# Altium integrated library Weidmueller_OMNIMATE_Signal.IntLib: 2550 symbols (part 19 of 45) (continued)
## 1727850000 (continued)
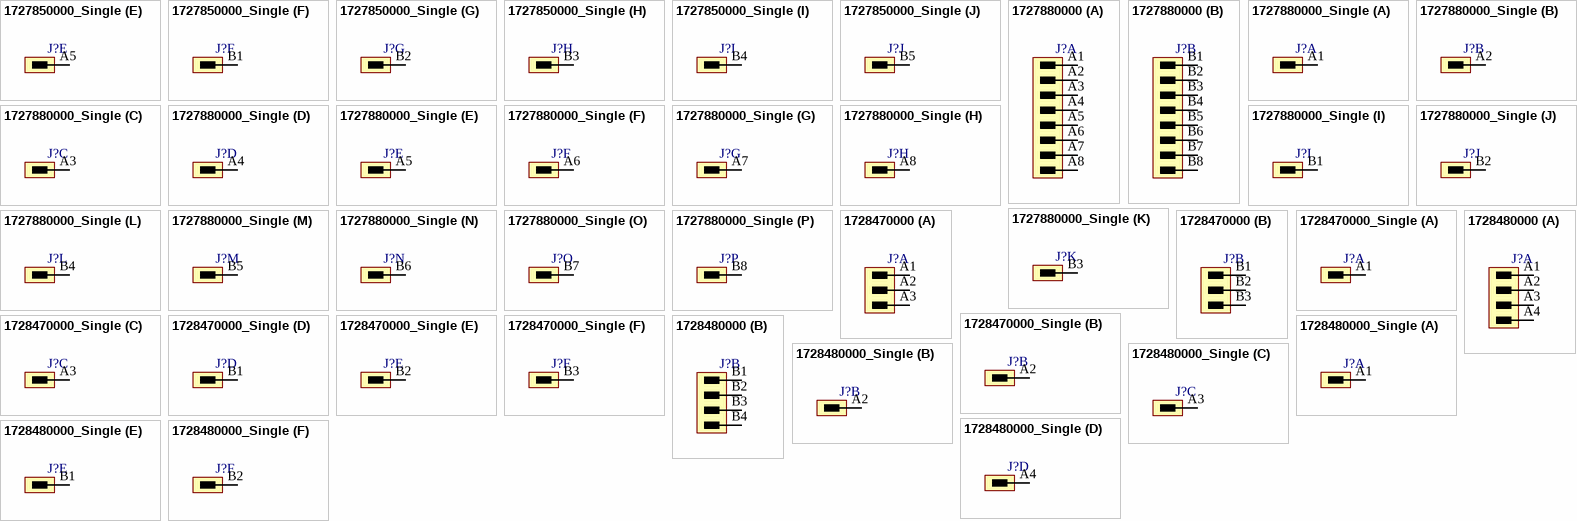
[diagram p105: symbols 1727850000_Single to 1728480000_Single]

## 1727850000_Single
designator J?
OMNIMATE Signal - series B2L/S2L 3.50 - 2-row; PartNumber: 1727850000; Manufacturer: Weidmueller; Short_text_for_material: S2L 3.50/10/90G 3.5SN OR BX; Side_termination_characteristic: closed side; Mounting_onto_the_PCB: Solder connection; Pitch_mm: 3.5 mm; Pitch_inch: 0.138 inch; No_of_poles: 10; Outgoing_elbow: 90°; Contact_material: Cu-Leg; Contact_surface: tinned; Insulating_material: PBT; UL_94_flammability_rating: V-0; Rated_voltage_for_surge_voltage_class_pollution_degree_II_2: 250 V; Rated_voltage_use_group_B_UL_1059: 150 V; Rated_current_use_group_B_UL_1059: 10 A; PackageReference: S2L_3_50_90G_10; Colour: Orange; Solder_pin_length_mm: 3.5 mm; Packaging: Box; Qty: 50 PCS; Revision: V1; ComponentLink1Description: Manufacturer URL; ComponentLink1URL: http://www.weidmueller.com/; ComponentLink2Description: URL Link1; ComponentLink2URL: http://catalog.weidmueller.com/catalog/Start.do?localeId=en&ObjectID=1727850000
footprint S2L_3_50_90G_10 (OMNIMATE Signal - Serie B2L/S2L 3.50 - 2-reihig  S2L 3.50/10/90G 3.5)
part A pins: A1
part B pins: A2
part C pins: A3
part D pins: A4
part E pins: A5
part F pins: B1
part G pins: B2
part H pins: B3
part I pins: B4
part J pins: B5

## 1727880000
designator J?
OMNIMATE Signal - series B2L/S2L 3.50 - 2-row; PartNumber: 1727880000; Manufacturer: Weidmueller; Short_text_for_material: S2L 3.50/16/90G 3.5SN OR BX; Side_termination_characteristic: closed side; Mounting_onto_the_PCB: Solder connection; Pitch_mm: 3.5 mm; Pitch_inch: 0.138 inch; No_of_poles: 16; Outgoing_elbow: 90°; Contact_material: Cu-Leg; Contact_surface: tinned; Insulating_material: PBT; UL_94_flammability_rating: V-0; Rated_voltage_for_surge_voltage_class_pollution_degree_II_2: 250 V; Rated_voltage_use_group_B_UL_1059: 150 V; Rated_current_use_group_B_UL_1059: 10 A; PackageReference: S2L_3_50_90G_16; Colour: Orange; Solder_pin_length_mm: 3.5 mm; Packaging: Box; Qty: 50 PCS; Revision: V1; ComponentLink1Description: Manufacturer URL; ComponentLink1URL: http://www.weidmueller.com/; ComponentLink2Description: URL Link1; ComponentLink2URL: http://catalog.weidmueller.com/catalog/Start.do?localeId=en&ObjectID=1727880000
footprint S2L_3_50_90G_16 (OMNIMATE Signal - Serie B2L/S2L 3.50 - 2-reihig  S2L 3.50/16/90G 3.5)
part A pins: A1, A2, A3, A4, A5, A6, A7, A8
part B pins: B1, B2, B3, B4, B5, B6, B7, B8

## 1727880000_Single
designator J?
OMNIMATE Signal - series B2L/S2L 3.50 - 2-row; PartNumber: 1727880000; Manufacturer: Weidmueller; Short_text_for_material: S2L 3.50/16/90G 3.5SN OR BX; Side_termination_characteristic: closed side; Mounting_onto_the_PCB: Solder connection; Pitch_mm: 3.5 mm; Pitch_inch: 0.138 inch; No_of_poles: 16; Outgoing_elbow: 90°; Contact_material: Cu-Leg; Contact_surface: tinned; Insulating_material: PBT; UL_94_flammability_rating: V-0; Rated_voltage_for_surge_voltage_class_pollution_degree_II_2: 250 V; Rated_voltage_use_group_B_UL_1059: 150 V; Rated_current_use_group_B_UL_1059: 10 A; PackageReference: S2L_3_50_90G_16; Colour: Orange; Solder_pin_length_mm: 3.5 mm; Packaging: Box; Qty: 50 PCS; Revision: V1; ComponentLink1Description: Manufacturer URL; ComponentLink1URL: http://www.weidmueller.com/; ComponentLink2Description: URL Link1; ComponentLink2URL: http://catalog.weidmueller.com/catalog/Start.do?localeId=en&ObjectID=1727880000
footprint S2L_3_50_90G_16 (OMNIMATE Signal - Serie B2L/S2L 3.50 - 2-reihig  S2L 3.50/16/90G 3.5)
part A pins: A1
part B pins: A2
part C pins: A3
part D pins: A4
part E pins: A5
part F pins: A6
part G pins: A7
part H pins: A8
part I pins: B1
part J pins: B2
part K pins: B3
part L pins: B4
part M pins: B5
part N pins: B6
part O pins: B7
part P pins: B8

## 1728470000
designator J?
OMNIMATE Signal - series B2L/S2L 3.50 - 2-row; PartNumber: 1728470000; Manufacturer: Weidmueller; Short_text_for_material: S2L 3.50/06/90F 3.5SN OR BX; Side_termination_characteristic: Flange; Mounting_onto_the_PCB: Solder connection; Pitch_mm: 3.5 mm; Pitch_inch: 0.138 inch; No_of_poles: 6; Outgoing_elbow: 90°; Contact_material: Cu-Leg; Contact_surface: tinned; Insulating_material: PBT; UL_94_flammability_rating: V-0; Rated_voltage_for_surge_voltage_class_pollution_degree_II_2: 250 V; Rated_voltage_use_group_B_UL_1059: 150 V; Rated_current_use_group_B_UL_1059: 10 A; PackageReference: S2L_3_50_90F_06; Colour: Orange; Solder_pin_length_mm: 3.5 mm; Packaging: Box; Qty: 50 PCS; Revision: V1; ComponentLink1Description: Manufacturer URL; ComponentLink1URL: http://www.weidmueller.com/; ComponentLink2Description: URL Link1; ComponentLink2URL: http://catalog.weidmueller.com/catalog/Start.do?localeId=en&ObjectID=1728470000
footprint S2L_3_50_90F_06 (OMNIMATE Signal - Serie B2L/S2L 3.50 - 2-reihig  S2L 3.50/06/90F 3.5)
part A pins: A1, A2, A3
part B pins: B1, B2, B3

## 1728470000_Single
designator J?
OMNIMATE Signal - series B2L/S2L 3.50 - 2-row; PartNumber: 1728470000; Manufacturer: Weidmueller; Short_text_for_material: S2L 3.50/06/90F 3.5SN OR BX; Side_termination_characteristic: Flange; Mounting_onto_the_PCB: Solder connection; Pitch_mm: 3.5 mm; Pitch_inch: 0.138 inch; No_of_poles: 6; Outgoing_elbow: 90°; Contact_material: Cu-Leg; Contact_surface: tinned; Insulating_material: PBT; UL_94_flammability_rating: V-0; Rated_voltage_for_surge_voltage_class_pollution_degree_II_2: 250 V; Rated_voltage_use_group_B_UL_1059: 150 V; Rated_current_use_group_B_UL_1059: 10 A; PackageReference: S2L_3_50_90F_06; Colour: Orange; Solder_pin_length_mm: 3.5 mm; Packaging: Box; Qty: 50 PCS; Revision: V1; ComponentLink1Description: Manufacturer URL; ComponentLink1URL: http://www.weidmueller.com/; ComponentLink2Description: URL Link1; ComponentLink2URL: http://catalog.weidmueller.com/catalog/Start.do?localeId=en&ObjectID=1728470000
footprint S2L_3_50_90F_06 (OMNIMATE Signal - Serie B2L/S2L 3.50 - 2-reihig  S2L 3.50/06/90F 3.5)
part A pins: A1
part B pins: A2
part C pins: A3
part D pins: B1
part E pins: B2
part F pins: B3

## 1728480000
designator J?
OMNIMATE Signal - series B2L/S2L 3.50 - 2-row; PartNumber: 1728480000; Manufacturer: Weidmueller; Short_text_for_material: S2L 3.50/08/90F 3.5SN OR BX; Side_termination_characteristic: Flange; Mounting_onto_the_PCB: Solder connection; Pitch_mm: 3.5 mm; Pitch_inch: 0.138 inch; No_of_poles: 8; Outgoing_elbow: 90°; Contact_material: Cu-Leg; Contact_surface: tinned; Insulating_material: PBT; UL_94_flammability_rating: V-0; Rated_voltage_for_surge_voltage_class_pollution_degree_II_2: 250 V; Rated_voltage_use_group_B_UL_1059: 150 V; Rated_current_use_group_B_UL_1059: 10 A; PackageReference: S2L_3_50_90F_08; Colour: Orange; Solder_pin_length_mm: 3.5 mm; Packaging: Box; Qty: 50 PCS; Revision: V1; ComponentLink1Description: Manufacturer URL; ComponentLink1URL: http://www.weidmueller.com/; ComponentLink2Description: URL Link1; ComponentLink2URL: http://catalog.weidmueller.com/catalog/Start.do?localeId=en&ObjectID=1728480000
footprint S2L_3_50_90F_08 (OMNIMATE Signal - Serie B2L/S2L 3.50 - 2-reihig  S2L 3.50/08/90F 3.5)
part A pins: A1, A2, A3, A4
part B pins: B1, B2, B3, B4

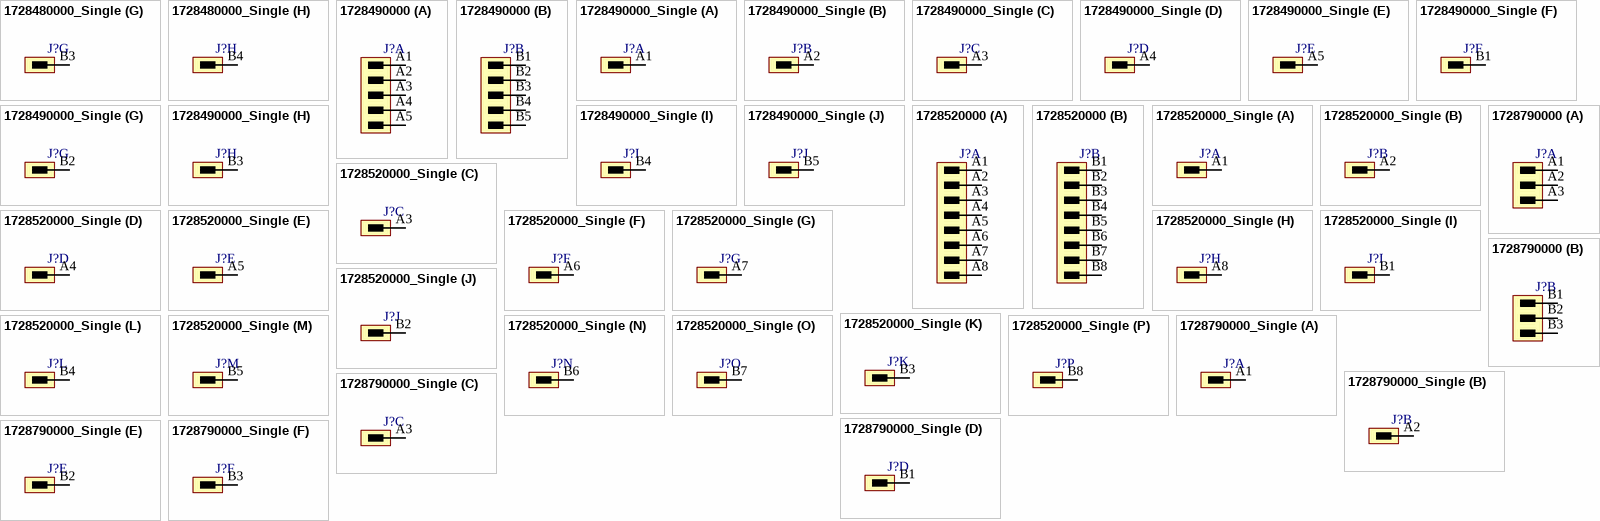
[diagram p106: symbols 1728480000_Single to 1728790000_Single]

## 1728480000_Single
designator J?
OMNIMATE Signal - series B2L/S2L 3.50 - 2-row; PartNumber: 1728480000; Manufacturer: Weidmueller; Short_text_for_material: S2L 3.50/08/90F 3.5SN OR BX; Side_termination_characteristic: Flange; Mounting_onto_the_PCB: Solder connection; Pitch_mm: 3.5 mm; Pitch_inch: 0.138 inch; No_of_poles: 8; Outgoing_elbow: 90°; Contact_material: Cu-Leg; Contact_surface: tinned; Insulating_material: PBT; UL_94_flammability_rating: V-0; Rated_voltage_for_surge_voltage_class_pollution_degree_II_2: 250 V; Rated_voltage_use_group_B_UL_1059: 150 V; Rated_current_use_group_B_UL_1059: 10 A; PackageReference: S2L_3_50_90F_08; Colour: Orange; Solder_pin_length_mm: 3.5 mm; Packaging: Box; Qty: 50 PCS; Revision: V1; ComponentLink1Description: Manufacturer URL; ComponentLink1URL: http://www.weidmueller.com/; ComponentLink2Description: URL Link1; ComponentLink2URL: http://catalog.weidmueller.com/catalog/Start.do?localeId=en&ObjectID=1728480000
footprint S2L_3_50_90F_08 (OMNIMATE Signal - Serie B2L/S2L 3.50 - 2-reihig  S2L 3.50/08/90F 3.5)
part A pins: A1
part B pins: A2
part C pins: A3
part D pins: A4
part E pins: B1
part F pins: B2
part G pins: B3
part H pins: B4

## 1728490000
designator J?
OMNIMATE Signal - series B2L/S2L 3.50 - 2-row; PartNumber: 1728490000; Manufacturer: Weidmueller; Short_text_for_material: S2L 3.50/10/90F 3.5SN OR BX; Side_termination_characteristic: Flange; Mounting_onto_the_PCB: Solder connection; Pitch_mm: 3.5 mm; Pitch_inch: 0.138 inch; No_of_poles: 10; Outgoing_elbow: 90°; Contact_material: Cu-Leg; Contact_surface: tinned; Insulating_material: PBT; UL_94_flammability_rating: V-0; Rated_voltage_for_surge_voltage_class_pollution_degree_II_2: 250 V; Rated_voltage_use_group_B_UL_1059: 150 V; Rated_current_use_group_B_UL_1059: 10 A; PackageReference: S2L_3_50_90F_10; Colour: Orange; Solder_pin_length_mm: 3.5 mm; Packaging: Box; Qty: 50 PCS; Revision: V1; ComponentLink1Description: Manufacturer URL; ComponentLink1URL: http://www.weidmueller.com/; ComponentLink2Description: URL Link1; ComponentLink2URL: http://catalog.weidmueller.com/catalog/Start.do?localeId=en&ObjectID=1728490000
footprint S2L_3_50_90F_10 (OMNIMATE Signal - Serie B2L/S2L 3.50 - 2-reihig  S2L 3.50/10/90F 3.5)
part A pins: A1, A2, A3, A4, A5
part B pins: B1, B2, B3, B4, B5

## 1728490000_Single
designator J?
OMNIMATE Signal - series B2L/S2L 3.50 - 2-row; PartNumber: 1728490000; Manufacturer: Weidmueller; Short_text_for_material: S2L 3.50/10/90F 3.5SN OR BX; Side_termination_characteristic: Flange; Mounting_onto_the_PCB: Solder connection; Pitch_mm: 3.5 mm; Pitch_inch: 0.138 inch; No_of_poles: 10; Outgoing_elbow: 90°; Contact_material: Cu-Leg; Contact_surface: tinned; Insulating_material: PBT; UL_94_flammability_rating: V-0; Rated_voltage_for_surge_voltage_class_pollution_degree_II_2: 250 V; Rated_voltage_use_group_B_UL_1059: 150 V; Rated_current_use_group_B_UL_1059: 10 A; PackageReference: S2L_3_50_90F_10; Colour: Orange; Solder_pin_length_mm: 3.5 mm; Packaging: Box; Qty: 50 PCS; Revision: V1; ComponentLink1Description: Manufacturer URL; ComponentLink1URL: http://www.weidmueller.com/; ComponentLink2Description: URL Link1; ComponentLink2URL: http://catalog.weidmueller.com/catalog/Start.do?localeId=en&ObjectID=1728490000
footprint S2L_3_50_90F_10 (OMNIMATE Signal - Serie B2L/S2L 3.50 - 2-reihig  S2L 3.50/10/90F 3.5)
part A pins: A1
part B pins: A2
part C pins: A3
part D pins: A4
part E pins: A5
part F pins: B1
part G pins: B2
part H pins: B3
part I pins: B4
part J pins: B5

## 1728520000
designator J?
OMNIMATE Signal - series B2L/S2L 3.50 - 2-row; PartNumber: 1728520000; Manufacturer: Weidmueller; Short_text_for_material: S2L 3.50/16/90F 3.5SN OR BX; Side_termination_characteristic: Flange; Mounting_onto_the_PCB: Solder connection; Pitch_mm: 3.5 mm; Pitch_inch: 0.138 inch; No_of_poles: 16; Outgoing_elbow: 90°; Contact_material: Cu-Leg; Contact_surface: tinned; Insulating_material: PBT; UL_94_flammability_rating: V-0; Rated_voltage_for_surge_voltage_class_pollution_degree_II_2: 250 V; Rated_voltage_use_group_B_UL_1059: 150 V; Rated_current_use_group_B_UL_1059: 10 A; PackageReference: S2L_3_50_90F_16; Colour: Orange; Solder_pin_length_mm: 3.5 mm; Packaging: Box; Qty: 50 PCS; Revision: V1; ComponentLink1Description: Manufacturer URL; ComponentLink1URL: http://www.weidmueller.com/; ComponentLink2Description: URL Link1; ComponentLink2URL: http://catalog.weidmueller.com/catalog/Start.do?localeId=en&ObjectID=1728520000
footprint S2L_3_50_90F_16 (OMNIMATE Signal - Serie B2L/S2L 3.50 - 2-reihig  S2L 3.50/16/90F 3.5)
part A pins: A1, A2, A3, A4, A5, A6, A7, A8
part B pins: B1, B2, B3, B4, B5, B6, B7, B8

## 1728520000_Single
designator J?
OMNIMATE Signal - series B2L/S2L 3.50 - 2-row; PartNumber: 1728520000; Manufacturer: Weidmueller; Short_text_for_material: S2L 3.50/16/90F 3.5SN OR BX; Side_termination_characteristic: Flange; Mounting_onto_the_PCB: Solder connection; Pitch_mm: 3.5 mm; Pitch_inch: 0.138 inch; No_of_poles: 16; Outgoing_elbow: 90°; Contact_material: Cu-Leg; Contact_surface: tinned; Insulating_material: PBT; UL_94_flammability_rating: V-0; Rated_voltage_for_surge_voltage_class_pollution_degree_II_2: 250 V; Rated_voltage_use_group_B_UL_1059: 150 V; Rated_current_use_group_B_UL_1059: 10 A; PackageReference: S2L_3_50_90F_16; Colour: Orange; Solder_pin_length_mm: 3.5 mm; Packaging: Box; Qty: 50 PCS; Revision: V1; ComponentLink1Description: Manufacturer URL; ComponentLink1URL: http://www.weidmueller.com/; ComponentLink2Description: URL Link1; ComponentLink2URL: http://catalog.weidmueller.com/catalog/Start.do?localeId=en&ObjectID=1728520000
footprint S2L_3_50_90F_16 (OMNIMATE Signal - Serie B2L/S2L 3.50 - 2-reihig  S2L 3.50/16/90F 3.5)
part A pins: A1
part B pins: A2
part C pins: A3
part D pins: A4
part E pins: A5
part F pins: A6
part G pins: A7
part H pins: A8
part I pins: B1
part J pins: B2
part K pins: B3
part L pins: B4
part M pins: B5
part N pins: B6
part O pins: B7
part P pins: B8

## 1728790000
designator J?
OMNIMATE Signal - series B2L/S2L 3.50 - 2-row; PartNumber: 1728790000; Manufacturer: Weidmueller; Short_text_for_material: S2L 3.50/06/180G 3.5SN OR BX; Side_termination_characteristic: closed side; Mounting_onto_the_PCB: Solder connection; Pitch_mm: 3.5 mm; Pitch_inch: 0.138 inch; No_of_poles: 6; Outgoing_elbow: 180°; Contact_material: Cu-Leg; Contact_surface: tinned; Insulating_material: PBT; UL_94_flammability_rating: V-0; Rated_voltage_for_surge_voltage_class_pollution_degree_II_2: 250 V; Rated_voltage_use_group_B_UL_1059: 150 V; Rated_current_use_group_B_UL_1059: 10 A; PackageReference: S2L_3_50_180G_06; Colour: Orange; Solder_pin_length_mm: 3.5 mm; Packaging: Box; Qty: 50 PCS; Revision: V1; ComponentLink1Description: Manufacturer URL; ComponentLink1URL: http://www.weidmueller.com/; ComponentLink2Description: URL Link1; ComponentLink2URL: http://catalog.weidmueller.com/catalog/Start.do?localeId=en&ObjectID=1728790000
footprint S2L_3_50_180G_06 (OMNIMATE Signal - Serie B2L/S2L 3.50 - 2-reihig  S2L 3.50/06/180G 3.5)
part A pins: A1, A2, A3
part B pins: B1, B2, B3

## 1728790000_Single
designator J?
OMNIMATE Signal - series B2L/S2L 3.50 - 2-row; PartNumber: 1728790000; Manufacturer: Weidmueller; Short_text_for_material: S2L 3.50/06/180G 3.5SN OR BX; Side_termination_characteristic: closed side; Mounting_onto_the_PCB: Solder connection; Pitch_mm: 3.5 mm; Pitch_inch: 0.138 inch; No_of_poles: 6; Outgoing_elbow: 180°; Contact_material: Cu-Leg; Contact_surface: tinned; Insulating_material: PBT; UL_94_flammability_rating: V-0; Rated_voltage_for_surge_voltage_class_pollution_degree_II_2: 250 V; Rated_voltage_use_group_B_UL_1059: 150 V; Rated_current_use_group_B_UL_1059: 10 A; PackageReference: S2L_3_50_180G_06; Colour: Orange; Solder_pin_length_mm: 3.5 mm; Packaging: Box; Qty: 50 PCS; Revision: V1; ComponentLink1Description: Manufacturer URL; ComponentLink1URL: http://www.weidmueller.com/; ComponentLink2Description: URL Link1; ComponentLink2URL: http://catalog.weidmueller.com/catalog/Start.do?localeId=en&ObjectID=1728790000
footprint S2L_3_50_180G_06 (OMNIMATE Signal - Serie B2L/S2L 3.50 - 2-reihig  S2L 3.50/06/180G 3.5)
part A pins: A1
part B pins: A2
part C pins: A3
part D pins: B1
part E pins: B2
part F pins: B3

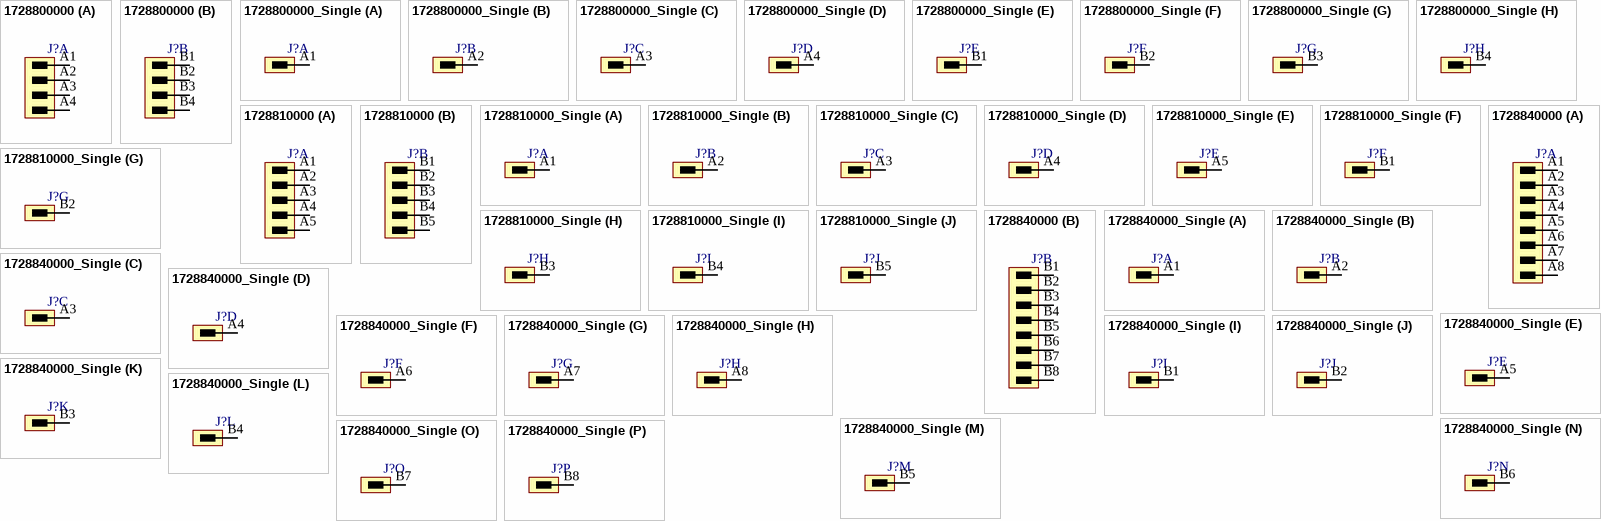
[diagram p107: symbols 1728800000 to 1728840000_Single]

## 1728800000
designator J?
OMNIMATE Signal - series B2L/S2L 3.50 - 2-row; PartNumber: 1728800000; Manufacturer: Weidmueller; Short_text_for_material: S2L 3.50/08/180G 3.5SN OR BX; Side_termination_characteristic: closed side; Mounting_onto_the_PCB: Solder connection; Pitch_mm: 3.5 mm; Pitch_inch: 0.138 inch; No_of_poles: 8; Outgoing_elbow: 180°; Contact_material: Cu-Leg; Contact_surface: tinned; Insulating_material: PBT; UL_94_flammability_rating: V-0; Rated_voltage_for_surge_voltage_class_pollution_degree_II_2: 250 V; Rated_voltage_use_group_B_UL_1059: 150 V; Rated_current_use_group_B_UL_1059: 10 A; PackageReference: S2L_3_50_180G_08; Colour: Orange; Solder_pin_length_mm: 3.5 mm; Packaging: Box; Qty: 50 PCS; Revision: V1; ComponentLink1Description: Manufacturer URL; ComponentLink1URL: http://www.weidmueller.com/; ComponentLink2Description: URL Link1; ComponentLink2URL: http://catalog.weidmueller.com/catalog/Start.do?localeId=en&ObjectID=1728800000
footprint S2L_3_50_180G_08 (OMNIMATE Signal - Serie B2L/S2L 3.50 - 2-reihig  S2L 3.50/08/180G 3.5)
part A pins: A1, A2, A3, A4
part B pins: B1, B2, B3, B4

## 1728800000_Single
designator J?
OMNIMATE Signal - series B2L/S2L 3.50 - 2-row; PartNumber: 1728800000; Manufacturer: Weidmueller; Short_text_for_material: S2L 3.50/08/180G 3.5SN OR BX; Side_termination_characteristic: closed side; Mounting_onto_the_PCB: Solder connection; Pitch_mm: 3.5 mm; Pitch_inch: 0.138 inch; No_of_poles: 8; Outgoing_elbow: 180°; Contact_material: Cu-Leg; Contact_surface: tinned; Insulating_material: PBT; UL_94_flammability_rating: V-0; Rated_voltage_for_surge_voltage_class_pollution_degree_II_2: 250 V; Rated_voltage_use_group_B_UL_1059: 150 V; Rated_current_use_group_B_UL_1059: 10 A; PackageReference: S2L_3_50_180G_08; Colour: Orange; Solder_pin_length_mm: 3.5 mm; Packaging: Box; Qty: 50 PCS; Revision: V1; ComponentLink1Description: Manufacturer URL; ComponentLink1URL: http://www.weidmueller.com/; ComponentLink2Description: URL Link1; ComponentLink2URL: http://catalog.weidmueller.com/catalog/Start.do?localeId=en&ObjectID=1728800000
footprint S2L_3_50_180G_08 (OMNIMATE Signal - Serie B2L/S2L 3.50 - 2-reihig  S2L 3.50/08/180G 3.5)
part A pins: A1
part B pins: A2
part C pins: A3
part D pins: A4
part E pins: B1
part F pins: B2
part G pins: B3
part H pins: B4

## 1728810000
designator J?
OMNIMATE Signal - series B2L/S2L 3.50 - 2-row; PartNumber: 1728810000; Manufacturer: Weidmueller; Short_text_for_material: S2L 3.50/10/180G 3.5SN OR BX; Side_termination_characteristic: closed side; Mounting_onto_the_PCB: Solder connection; Pitch_mm: 3.5 mm; Pitch_inch: 0.138 inch; No_of_poles: 10; Outgoing_elbow: 180°; Contact_material: Cu-Leg; Contact_surface: tinned; Insulating_material: PBT; UL_94_flammability_rating: V-0; Rated_voltage_for_surge_voltage_class_pollution_degree_II_2: 250 V; Rated_voltage_use_group_B_UL_1059: 150 V; Rated_current_use_group_B_UL_1059: 10 A; PackageReference: S2L_3_50_180G_10; Colour: Orange; Solder_pin_length_mm: 3.5 mm; Packaging: Box; Qty: 50 PCS; Revision: V1; ComponentLink1Description: Manufacturer URL; ComponentLink1URL: http://www.weidmueller.com/; ComponentLink2Description: URL Link1; ComponentLink2URL: http://catalog.weidmueller.com/catalog/Start.do?localeId=en&ObjectID=1728810000
footprint S2L_3_50_180G_10 (OMNIMATE Signal - Serie B2L/S2L 3.50 - 2-reihig  S2L 3.50/10/180G 3.5)
part A pins: A1, A2, A3, A4, A5
part B pins: B1, B2, B3, B4, B5

## 1728810000_Single
designator J?
OMNIMATE Signal - series B2L/S2L 3.50 - 2-row; PartNumber: 1728810000; Manufacturer: Weidmueller; Short_text_for_material: S2L 3.50/10/180G 3.5SN OR BX; Side_termination_characteristic: closed side; Mounting_onto_the_PCB: Solder connection; Pitch_mm: 3.5 mm; Pitch_inch: 0.138 inch; No_of_poles: 10; Outgoing_elbow: 180°; Contact_material: Cu-Leg; Contact_surface: tinned; Insulating_material: PBT; UL_94_flammability_rating: V-0; Rated_voltage_for_surge_voltage_class_pollution_degree_II_2: 250 V; Rated_voltage_use_group_B_UL_1059: 150 V; Rated_current_use_group_B_UL_1059: 10 A; PackageReference: S2L_3_50_180G_10; Colour: Orange; Solder_pin_length_mm: 3.5 mm; Packaging: Box; Qty: 50 PCS; Revision: V1; ComponentLink1Description: Manufacturer URL; ComponentLink1URL: http://www.weidmueller.com/; ComponentLink2Description: URL Link1; ComponentLink2URL: http://catalog.weidmueller.com/catalog/Start.do?localeId=en&ObjectID=1728810000
footprint S2L_3_50_180G_10 (OMNIMATE Signal - Serie B2L/S2L 3.50 - 2-reihig  S2L 3.50/10/180G 3.5)
part A pins: A1
part B pins: A2
part C pins: A3
part D pins: A4
part E pins: A5
part F pins: B1
part G pins: B2
part H pins: B3
part I pins: B4
part J pins: B5

## 1728840000
designator J?
OMNIMATE Signal - series B2L/S2L 3.50 - 2-row; PartNumber: 1728840000; Manufacturer: Weidmueller; Short_text_for_material: S2L 3.50/16/180G 3.5SN OR BX; Side_termination_characteristic: closed side; Mounting_onto_the_PCB: Solder connection; Pitch_mm: 3.5 mm; Pitch_inch: 0.138 inch; No_of_poles: 16; Outgoing_elbow: 180°; Contact_material: Cu-Leg; Contact_surface: tinned; Insulating_material: PBT; UL_94_flammability_rating: V-0; Rated_voltage_for_surge_voltage_class_pollution_degree_II_2: 250 V; Rated_voltage_use_group_B_UL_1059: 150 V; Rated_current_use_group_B_UL_1059: 10 A; PackageReference: S2L_3_50_180G_16; Colour: Orange; Solder_pin_length_mm: 3.5 mm; Packaging: Box; Qty: 50 PCS; Revision: V1; ComponentLink1Description: Manufacturer URL; ComponentLink1URL: http://www.weidmueller.com/; ComponentLink2Description: URL Link1; ComponentLink2URL: http://catalog.weidmueller.com/catalog/Start.do?localeId=en&ObjectID=1728840000
footprint S2L_3_50_180G_16 (OMNIMATE Signal - Serie B2L/S2L 3.50 - 2-reihig  S2L 3.50/16/180G 3.5)
part A pins: A1, A2, A3, A4, A5, A6, A7, A8
part B pins: B1, B2, B3, B4, B5, B6, B7, B8

## 1728840000_Single
designator J?
OMNIMATE Signal - series B2L/S2L 3.50 - 2-row; PartNumber: 1728840000; Manufacturer: Weidmueller; Short_text_for_material: S2L 3.50/16/180G 3.5SN OR BX; Side_termination_characteristic: closed side; Mounting_onto_the_PCB: Solder connection; Pitch_mm: 3.5 mm; Pitch_inch: 0.138 inch; No_of_poles: 16; Outgoing_elbow: 180°; Contact_material: Cu-Leg; Contact_surface: tinned; Insulating_material: PBT; UL_94_flammability_rating: V-0; Rated_voltage_for_surge_voltage_class_pollution_degree_II_2: 250 V; Rated_voltage_use_group_B_UL_1059: 150 V; Rated_current_use_group_B_UL_1059: 10 A; PackageReference: S2L_3_50_180G_16; Colour: Orange; Solder_pin_length_mm: 3.5 mm; Packaging: Box; Qty: 50 PCS; Revision: V1; ComponentLink1Description: Manufacturer URL; ComponentLink1URL: http://www.weidmueller.com/; ComponentLink2Description: URL Link1; ComponentLink2URL: http://catalog.weidmueller.com/catalog/Start.do?localeId=en&ObjectID=1728840000
footprint S2L_3_50_180G_16 (OMNIMATE Signal - Serie B2L/S2L 3.50 - 2-reihig  S2L 3.50/16/180G 3.5)
part A pins: A1
part B pins: A2
part C pins: A3
part D pins: A4
part E pins: A5
part F pins: A6
part G pins: A7
part H pins: A8
part I pins: B1
part J pins: B2
part K pins: B3
part L pins: B4
part M pins: B5
part N pins: B6
part O pins: B7
part P pins: B8

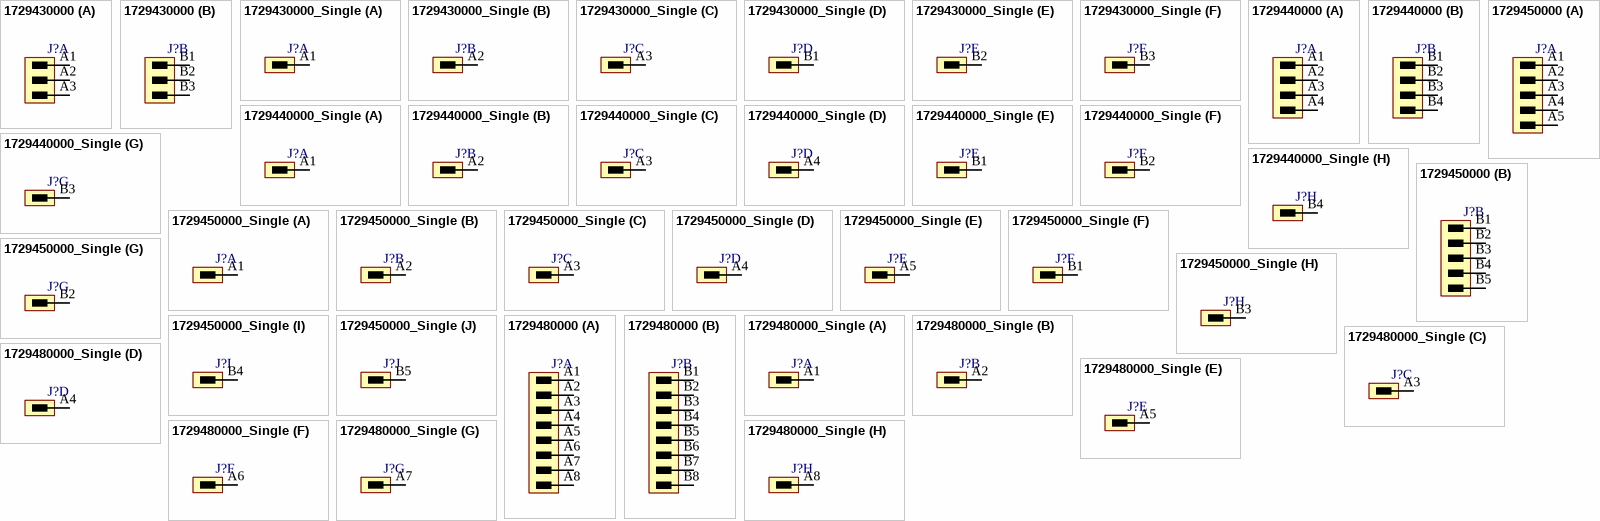
[diagram p108: symbols 1729430000 to 1729480000_Single]

## 1729430000
designator J?
OMNIMATE Signal - series B2L/S2L 3.50 - 2-row; PartNumber: 1729430000; Manufacturer: Weidmueller; Short_text_for_material: S2L 3.50/06/180F 3.5SN OR BX; Side_termination_characteristic: Flange; Mounting_onto_the_PCB: Solder connection; Pitch_mm: 3.5 mm; Pitch_inch: 0.138 inch; No_of_poles: 6; Outgoing_elbow: 180°; Contact_material: Cu-Leg; Contact_surface: tinned; Insulating_material: PBT; UL_94_flammability_rating: V-0; Rated_voltage_for_surge_voltage_class_pollution_degree_II_2: 250 V; Rated_voltage_use_group_B_UL_1059: 150 V; Rated_current_use_group_B_UL_1059: 10 A; PackageReference: S2L_3_50_180F_06; Colour: Orange; Solder_pin_length_mm: 3.5 mm; Packaging: Box; Qty: 50 PCS; Revision: V1; ComponentLink1Description: Manufacturer URL; ComponentLink1URL: http://www.weidmueller.com/; ComponentLink2Description: URL Link1; ComponentLink2URL: http://catalog.weidmueller.com/catalog/Start.do?localeId=en&ObjectID=1729430000
footprint S2L_3_50_180F_06 (OMNIMATE Signal - Serie B2L/S2L 3.50 - 2-reihig  S2L 3.50/06/180F 3.5)
part A pins: A1, A2, A3
part B pins: B1, B2, B3

## 1729430000_Single
designator J?
OMNIMATE Signal - series B2L/S2L 3.50 - 2-row; PartNumber: 1729430000; Manufacturer: Weidmueller; Short_text_for_material: S2L 3.50/06/180F 3.5SN OR BX; Side_termination_characteristic: Flange; Mounting_onto_the_PCB: Solder connection; Pitch_mm: 3.5 mm; Pitch_inch: 0.138 inch; No_of_poles: 6; Outgoing_elbow: 180°; Contact_material: Cu-Leg; Contact_surface: tinned; Insulating_material: PBT; UL_94_flammability_rating: V-0; Rated_voltage_for_surge_voltage_class_pollution_degree_II_2: 250 V; Rated_voltage_use_group_B_UL_1059: 150 V; Rated_current_use_group_B_UL_1059: 10 A; PackageReference: S2L_3_50_180F_06; Colour: Orange; Solder_pin_length_mm: 3.5 mm; Packaging: Box; Qty: 50 PCS; Revision: V1; ComponentLink1Description: Manufacturer URL; ComponentLink1URL: http://www.weidmueller.com/; ComponentLink2Description: URL Link1; ComponentLink2URL: http://catalog.weidmueller.com/catalog/Start.do?localeId=en&ObjectID=1729430000
footprint S2L_3_50_180F_06 (OMNIMATE Signal - Serie B2L/S2L 3.50 - 2-reihig  S2L 3.50/06/180F 3.5)
part A pins: A1
part B pins: A2
part C pins: A3
part D pins: B1
part E pins: B2
part F pins: B3

## 1729440000
designator J?
OMNIMATE Signal - series B2L/S2L 3.50 - 2-row; PartNumber: 1729440000; Manufacturer: Weidmueller; Short_text_for_material: S2L 3.50/08/180F 3.5SN OR BX; Side_termination_characteristic: Flange; Mounting_onto_the_PCB: Solder connection; Pitch_mm: 3.5 mm; Pitch_inch: 0.138 inch; No_of_poles: 8; Outgoing_elbow: 180°; Contact_material: Cu-Leg; Contact_surface: tinned; Insulating_material: PBT; UL_94_flammability_rating: V-0; Rated_voltage_for_surge_voltage_class_pollution_degree_II_2: 250 V; Rated_voltage_use_group_B_UL_1059: 150 V; Rated_current_use_group_B_UL_1059: 10 A; PackageReference: S2L_3_50_180F_08; Colour: Orange; Solder_pin_length_mm: 3.5 mm; Packaging: Box; Qty: 50 PCS; Revision: V1; ComponentLink1Description: Manufacturer URL; ComponentLink1URL: http://www.weidmueller.com/; ComponentLink2Description: URL Link1; ComponentLink2URL: http://catalog.weidmueller.com/catalog/Start.do?localeId=en&ObjectID=1729440000
footprint S2L_3_50_180F_08 (OMNIMATE Signal - Serie B2L/S2L 3.50 - 2-reihig  S2L 3.50/08/180F 3.5)
part A pins: A1, A2, A3, A4
part B pins: B1, B2, B3, B4

## 1729440000_Single
designator J?
OMNIMATE Signal - series B2L/S2L 3.50 - 2-row; PartNumber: 1729440000; Manufacturer: Weidmueller; Short_text_for_material: S2L 3.50/08/180F 3.5SN OR BX; Side_termination_characteristic: Flange; Mounting_onto_the_PCB: Solder connection; Pitch_mm: 3.5 mm; Pitch_inch: 0.138 inch; No_of_poles: 8; Outgoing_elbow: 180°; Contact_material: Cu-Leg; Contact_surface: tinned; Insulating_material: PBT; UL_94_flammability_rating: V-0; Rated_voltage_for_surge_voltage_class_pollution_degree_II_2: 250 V; Rated_voltage_use_group_B_UL_1059: 150 V; Rated_current_use_group_B_UL_1059: 10 A; PackageReference: S2L_3_50_180F_08; Colour: Orange; Solder_pin_length_mm: 3.5 mm; Packaging: Box; Qty: 50 PCS; Revision: V1; ComponentLink1Description: Manufacturer URL; ComponentLink1URL: http://www.weidmueller.com/; ComponentLink2Description: URL Link1; ComponentLink2URL: http://catalog.weidmueller.com/catalog/Start.do?localeId=en&ObjectID=1729440000
footprint S2L_3_50_180F_08 (OMNIMATE Signal - Serie B2L/S2L 3.50 - 2-reihig  S2L 3.50/08/180F 3.5)
part A pins: A1
part B pins: A2
part C pins: A3
part D pins: A4
part E pins: B1
part F pins: B2
part G pins: B3
part H pins: B4

## 1729450000
designator J?
OMNIMATE Signal - series B2L/S2L 3.50 - 2-row; PartNumber: 1729450000; Manufacturer: Weidmueller; Short_text_for_material: S2L 3.50/10/180F 3.5SN OR BX; Side_termination_characteristic: Flange; Mounting_onto_the_PCB: Solder connection; Pitch_mm: 3.5 mm; Pitch_inch: 0.138 inch; No_of_poles: 10; Outgoing_elbow: 180°; Contact_material: Cu-Leg; Contact_surface: tinned; Insulating_material: PBT; UL_94_flammability_rating: V-0; Rated_voltage_for_surge_voltage_class_pollution_degree_II_2: 250 V; Rated_voltage_use_group_B_UL_1059: 150 V; Rated_current_use_group_B_UL_1059: 10 A; PackageReference: S2L_3_50_180F_10; Colour: Orange; Solder_pin_length_mm: 3.5 mm; Packaging: Box; Qty: 50 PCS; Revision: V1; ComponentLink1Description: Manufacturer URL; ComponentLink1URL: http://www.weidmueller.com/; ComponentLink2Description: URL Link1; ComponentLink2URL: http://catalog.weidmueller.com/catalog/Start.do?localeId=en&ObjectID=1729450000
footprint S2L_3_50_180F_10 (OMNIMATE Signal - Serie B2L/S2L 3.50 - 2-reihig  S2L 3.50/10/180F 3.5)
part A pins: A1, A2, A3, A4, A5
part B pins: B1, B2, B3, B4, B5

## 1729450000_Single
designator J?
OMNIMATE Signal - series B2L/S2L 3.50 - 2-row; PartNumber: 1729450000; Manufacturer: Weidmueller; Short_text_for_material: S2L 3.50/10/180F 3.5SN OR BX; Side_termination_characteristic: Flange; Mounting_onto_the_PCB: Solder connection; Pitch_mm: 3.5 mm; Pitch_inch: 0.138 inch; No_of_poles: 10; Outgoing_elbow: 180°; Contact_material: Cu-Leg; Contact_surface: tinned; Insulating_material: PBT; UL_94_flammability_rating: V-0; Rated_voltage_for_surge_voltage_class_pollution_degree_II_2: 250 V; Rated_voltage_use_group_B_UL_1059: 150 V; Rated_current_use_group_B_UL_1059: 10 A; PackageReference: S2L_3_50_180F_10; Colour: Orange; Solder_pin_length_mm: 3.5 mm; Packaging: Box; Qty: 50 PCS; Revision: V1; ComponentLink1Description: Manufacturer URL; ComponentLink1URL: http://www.weidmueller.com/; ComponentLink2Description: URL Link1; ComponentLink2URL: http://catalog.weidmueller.com/catalog/Start.do?localeId=en&ObjectID=1729450000
footprint S2L_3_50_180F_10 (OMNIMATE Signal - Serie B2L/S2L 3.50 - 2-reihig  S2L 3.50/10/180F 3.5)
part A pins: A1
part B pins: A2
part C pins: A3
part D pins: A4
part E pins: A5
part F pins: B1
part G pins: B2
part H pins: B3
part I pins: B4
part J pins: B5

## 1729480000
designator J?
OMNIMATE Signal - series B2L/S2L 3.50 - 2-row; PartNumber: 1729480000; Manufacturer: Weidmueller; Short_text_for_material: S2L 3.50/16/180F 3.5SN OR BX; Side_termination_characteristic: Flange; Mounting_onto_the_PCB: Solder connection; Pitch_mm: 3.5 mm; Pitch_inch: 0.138 inch; No_of_poles: 16; Outgoing_elbow: 180°; Contact_material: Cu-Leg; Contact_surface: tinned; Insulating_material: PBT; UL_94_flammability_rating: V-0; Rated_voltage_for_surge_voltage_class_pollution_degree_II_2: 250 V; Rated_voltage_use_group_B_UL_1059: 150 V; Rated_current_use_group_B_UL_1059: 10 A; PackageReference: S2L_3_50_180F_16; Colour: Orange; Solder_pin_length_mm: 3.5 mm; Packaging: Box; Qty: 50 PCS; Revision: V1; ComponentLink1Description: Manufacturer URL; ComponentLink1URL: http://www.weidmueller.com/; ComponentLink2Description: URL Link1; ComponentLink2URL: http://catalog.weidmueller.com/catalog/Start.do?localeId=en&ObjectID=1729480000
footprint S2L_3_50_180F_16 (OMNIMATE Signal - Serie B2L/S2L 3.50 - 2-reihig  S2L 3.50/16/180F 3.5)
part A pins: A1, A2, A3, A4, A5, A6, A7, A8
part B pins: B1, B2, B3, B4, B5, B6, B7, B8

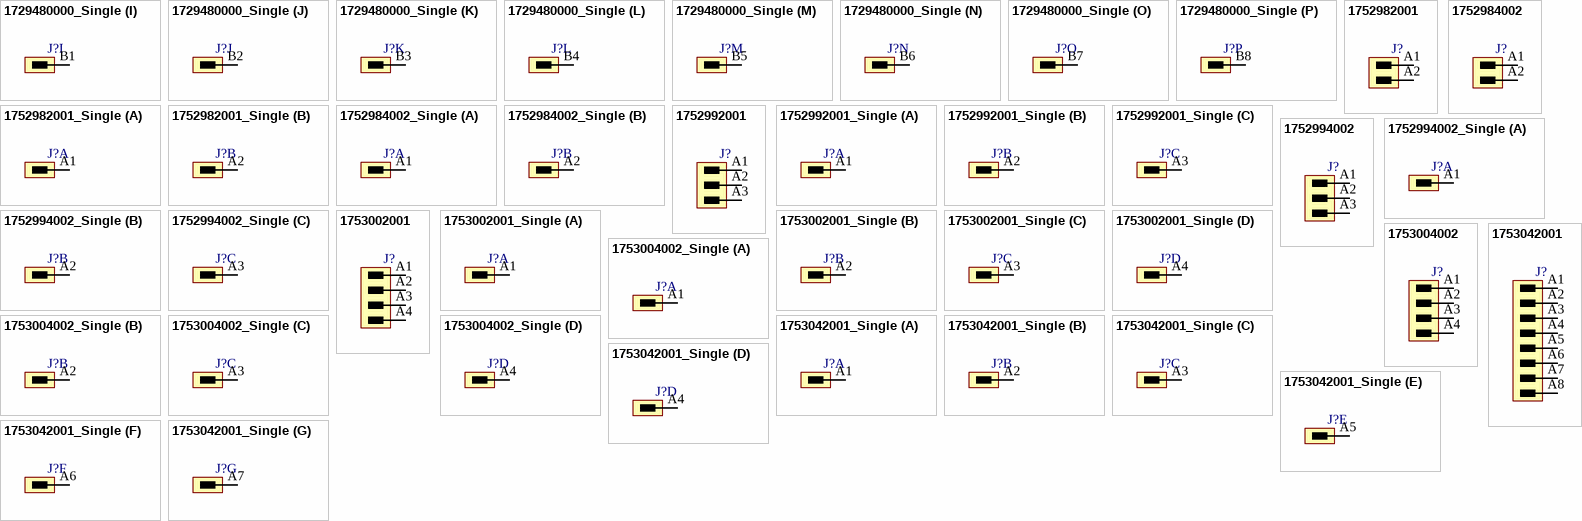
[diagram p109: symbols 1729480000_Single to 1753042001_Single]

## 1729480000_Single
designator J?
OMNIMATE Signal - series B2L/S2L 3.50 - 2-row; PartNumber: 1729480000; Manufacturer: Weidmueller; Short_text_for_material: S2L 3.50/16/180F 3.5SN OR BX; Side_termination_characteristic: Flange; Mounting_onto_the_PCB: Solder connection; Pitch_mm: 3.5 mm; Pitch_inch: 0.138 inch; No_of_poles: 16; Outgoing_elbow: 180°; Contact_material: Cu-Leg; Contact_surface: tinned; Insulating_material: PBT; UL_94_flammability_rating: V-0; Rated_voltage_for_surge_voltage_class_pollution_degree_II_2: 250 V; Rated_voltage_use_group_B_UL_1059: 150 V; Rated_current_use_group_B_UL_1059: 10 A; PackageReference: S2L_3_50_180F_16; Colour: Orange; Solder_pin_length_mm: 3.5 mm; Packaging: Box; Qty: 50 PCS; Revision: V1; ComponentLink1Description: Manufacturer URL; ComponentLink1URL: http://www.weidmueller.com/; ComponentLink2Description: URL Link1; ComponentLink2URL: http://catalog.weidmueller.com/catalog/Start.do?localeId=en&ObjectID=1729480000
footprint S2L_3_50_180F_16 (OMNIMATE Signal - Serie B2L/S2L 3.50 - 2-reihig  S2L 3.50/16/180F 3.5)
part A pins: A1
part B pins: A2
part C pins: A3
part D pins: A4
part E pins: A5
part F pins: A6
part G pins: A7
part H pins: A8
part I pins: B1
part J pins: B2
part K pins: B3
part L pins: B4
part M pins: B5
part N pins: B6
part O pins: B7
part P pins: B8

## 1752982001
designator J?
OMNIMATE Signal - series BL/SL 3.50; PartNumber: 1752982001; Manufacturer: Weidmueller; Short_text_for_material: SL-SMT 3.50/02/180G 1.5SN BK BX; Side_termination_characteristic: closed side; Mounting_onto_the_PCB: Reflow solder connection; Pitch_mm: 3.5 mm; Pitch_inch: 0.138 inch; No_of_poles: 2; Outgoing_elbow: 180°; Solder_pin_length_mm: 1.5 mm; Contact_material: CuSn; Contact_surface: tinned; Insulating_material: LCP GF; UL_94_flammability_rating: V-0; Rated_voltage_for_surge_voltage_class_pollution_degree_II_2: 320 V; Rated_voltage_use_group_B_UL_1059: 300 V; Rated_current_use_group_B_UL_1059: 10 A; PackageReference: SL_SMT_3_5_180G_02; Colour: Black; Packaging: Box; Qty: 100 PCS; Revision: V1; ComponentLink1Description: Manufacturer URL; ComponentLink1URL: http://www.weidmueller.com/; ComponentLink2Description: URL Link1; ComponentLink2URL: http://catalog.weidmueller.com/catalog/Start.do?localeId=en&ObjectID=1752982001
footprint SL_SMT_3_5_180G_02 (OMNIMATE Signal - Serie BL/SL 3.50  SL-SMT 3.50/02/180G 1.5)
pins: A1, A2

## 1752982001_Single
designator J?
OMNIMATE Signal - series BL/SL 3.50; PartNumber: 1752982001; Manufacturer: Weidmueller; Short_text_for_material: SL-SMT 3.50/02/180G 1.5SN BK BX; Side_termination_characteristic: closed side; Mounting_onto_the_PCB: Reflow solder connection; Pitch_mm: 3.5 mm; Pitch_inch: 0.138 inch; No_of_poles: 2; Outgoing_elbow: 180°; Solder_pin_length_mm: 1.5 mm; Contact_material: CuSn; Contact_surface: tinned; Insulating_material: LCP GF; UL_94_flammability_rating: V-0; Rated_voltage_for_surge_voltage_class_pollution_degree_II_2: 320 V; Rated_voltage_use_group_B_UL_1059: 300 V; Rated_current_use_group_B_UL_1059: 10 A; PackageReference: SL_SMT_3_5_180G_02; Colour: Black; Packaging: Box; Qty: 100 PCS; Revision: V1; ComponentLink1Description: Manufacturer URL; ComponentLink1URL: http://www.weidmueller.com/; ComponentLink2Description: URL Link1; ComponentLink2URL: http://catalog.weidmueller.com/catalog/Start.do?localeId=en&ObjectID=1752982001
footprint SL_SMT_3_5_180G_02 (OMNIMATE Signal - Serie BL/SL 3.50  SL-SMT 3.50/02/180G 1.5)
part A pins: A1
part B pins: A2

## 1752984002
designator J?
OMNIMATE Signal - series BL/SL 3.50; PartNumber: 1752984002; Manufacturer: Weidmueller; Short_text_for_material: SL-SMT 3.50/02/180G 1.5SN BK RL; Side_termination_characteristic: closed side; Mounting_onto_the_PCB: Reflow solder connection; Pitch_mm: 3.5 mm; Pitch_inch: 0.138 inch; No_of_poles: 2; Outgoing_elbow: 180°; Solder_pin_length_mm: 1.5 mm; Contact_surface: tinned; Insulating_material: LCP GF; UL_94_flammability_rating: V-0; Rated_voltage_for_surge_voltage_class_pollution_degree_II_2: 320 V; Rated_current_min_no_of_poles_TU_20_deg_C: 15 A; Rated_voltage_use_group_B_UL_1059: 300 V; Rated_current_use_group_B_UL_1059: 10 A; PackageReference: SL_SMT_3_5_180G_02; Colour: Black; Packaging: Tape; Qty: 265 PCS; Revision: V1; ComponentLink1Description: Manufacturer URL; ComponentLink1URL: http://www.weidmueller.com/; ComponentLink2Description: URL Link1; ComponentLink2URL: http://catalog.weidmueller.com/catalog/Start.do?localeId=en&ObjectID=1752984002
footprint SL_SMT_3_5_180G_02 (OMNIMATE Signal - Serie BL/SL 3.50  SL-SMT 3.50/02/180G 1.5)
pins: A1, A2